# Altium integrated library Connectores GAM.IntLib: 178 symbols (continued)
## MLX 7P 2.54mm (continued)
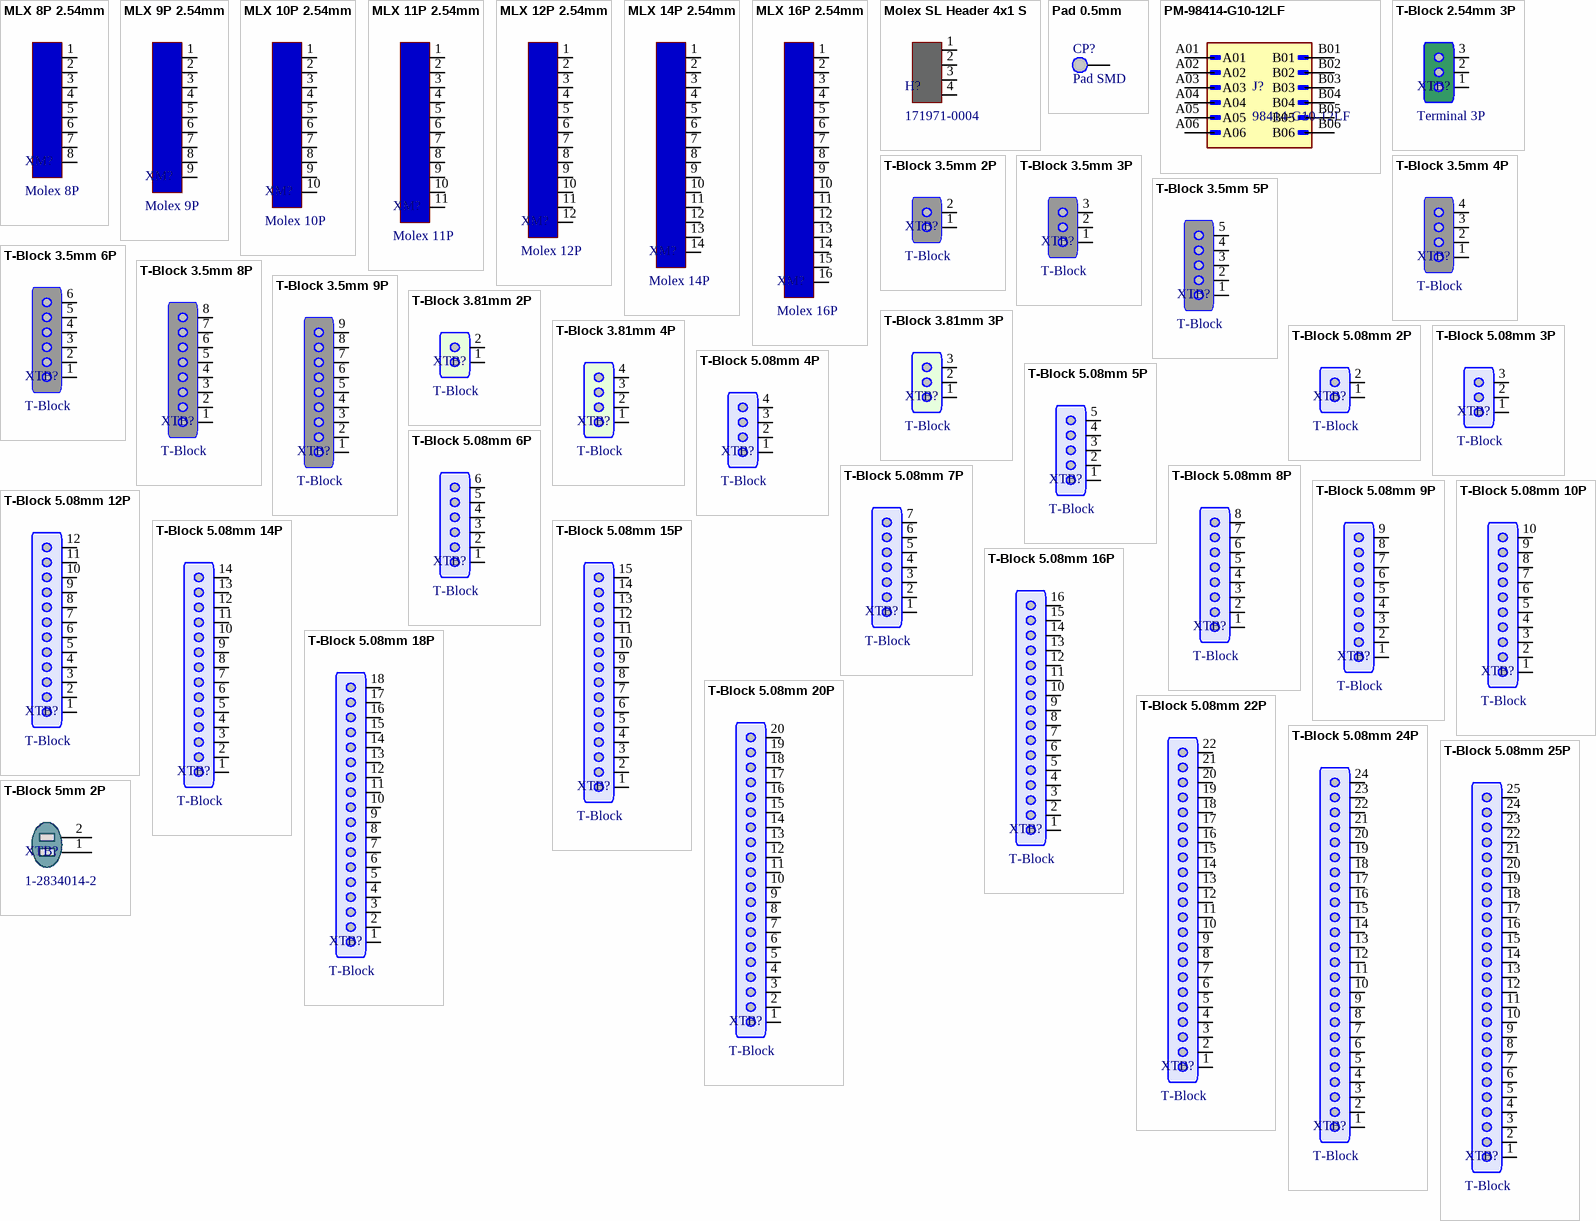
[diagram p2: symbols MLX 8P 2.54mm to T-Block 5mm 2P]

## MLX 8P 2.54mm
designator XM?, comment Molex 8P
Molex 8P 2.54mm
footprint Molex 8P 2.54mm
pins: 1, 2, 3, 4, 5, 6, 7, 8

## MLX 9P 2.54mm
designator XM?, comment Molex 9P
Molex 9P 2.54mm
footprint Molex 9P 2.54mm (Conector Tipo Molex 9P)
pins: 1, 2, 3, 4, 5, 6, 7, 8, 9

## MLX 10P 2.54mm
designator XM?, comment Molex 10P
Molex 10P 2.54mm
footprint Molex 10P 2.54mm (Conector Tipo Molex 10P)
pins: 1, 2, 3, 4, 5, 6, 7, 8, 9, 10

## MLX 11P 2.54mm
designator XM?, comment Molex 11P
Molex 11P 2.54mm
footprint Molex 11P 2.54mm (Conector Tipo Molex 11P)
pins: 1, 2, 3, 4, 5, 6, 7, 8, 9, 10, 11

## MLX 12P 2.54mm
designator XM?, comment Molex 12P
Molex 12P 2.54mm
footprint Molex 12P 2.54mm (Conector Tipo Molex 12P)
pins: 1, 2, 3, 4, 5, 6, 7, 8, 9, 10, 11, 12

## MLX 14P 2.54mm
designator XM?, comment Molex 14P
Molex 14P 2.54mm
footprint Molex 14P 2.54mm (Conector Tipo Molex 14P)
pins: 1, 2, 3, 4, 5, 6, 7, 8, 9, 10, 11, 12, 13, 14

## MLX 16P 2.54mm
designator XM?, comment Molex 16P
Molex 16P 2.54mm
footprint Molex 16P 2.54mm (Conector Tipo Molex 16P)
pins: 1, 2, 3, 4, 5, 6, 7, 8, 9, 10, 11, 12, 13, 14, 15, 16

## Molex SL Header 4x1 S
designator H?, comment 171971-0004
Molex 4P 2.54mm 171971-0004 Security Connector
footprint Molex 171971-0004 (Header Macho 171971-0004 Polaridad)
pins: 1, 2, 3, 4

## Pad 0.5mm
designator CP?, comment Pad SMD
footprint Pad 0.5mm (Pad 0.5mm x 1mm)
pins: 1 P

## PM-98414-G10-12LF
designator J?, comment 98414-G10-12LF
CONN HEADER VERT 12POS 2MM; Package: None; Price: None; Value: *; MP: 98414-G10-12LF; Availability: Unavailable
footprint AMPHENOL_98414-G10-12LF
pins: A01, A02, A03, A04, A05, A06, B01, B02, B03, B04, B05, B06

## T-Block 2.54mm 3P
designator XTB?, comment Terminal 3P
Terminal de Bloque 3P 2.54mm
footprint T-Block 3P 2.54mm (Terminal de Bloque 3P 2.54mm)
pins: 1, 2, 3

## T-Block 3.5mm 2P
designator XTB?, comment T-Block
Terminal de Bloque 2P 3.5mm 691412120002B
footprint T-BLOCK 2P 3.5mm (Terminal Block 2P 3.5mm)
pins: 1, 2

## T-Block 3.5mm 3P
designator XTB?, comment T-Block
Terminal de Bloque 3P 3.5mm 691412120003B
footprint T-BLOCK 3P 3.5mm (Terminal Block 3P 3.5mm)
pins: 1, 2, 3

## T-Block 3.5mm 4P
designator XTB?, comment T-Block
Terminal de Bloque 4P 3.5mm 691412120004B
footprint T-BLOCK 4P 3.5mm (Terminal Block 4P 3.5mm)
pins: 1, 2, 3, 4

## T-Block 3.5mm 5P
designator XTB?, comment T-Block
Terminal de Bloque 5P 3.5mm 691412120005B
footprint T-BLOCK 5P 3.5mm (Terminal Block 5P 3.5mm)
pins: 1, 2, 3, 4, 5

## T-Block 3.5mm 6P
designator XTB?, comment T-Block
Terminal de Bloque 6P 3.5mm 691412120006B
footprint T-BLOCK 6P 3.5mm (Terminal Block 6P 3.5mm)
pins: 1, 2, 3, 4, 5, 6

## T-Block 3.5mm 8P
designator XTB?, comment T-Block
Terminal de Bloque 8P 3.5mm 691412120008B
footprint T-BLOCK 8P 3.5mm (Terminal Block 8P 3.5mm)
pins: 1, 2, 3, 4, 5, 6, 7, 8

## T-Block 3.5mm 9P
designator XTB?, comment T-Block
Terminal de Bloque 9P 3.5mm 691412120009B
footprint T-BLOCK 9P 3.5mm (Terminal Block 9P 3.5mm)
pins: 1, 2, 3, 4, 5, 6, 7, 8, 9

## T-Block 3.81mm 2P
designator XTB?, comment T-Block
Terminal de Bloque 2P 3.81mm
footprint T-BLOCK 2P 3.81mm (Terminal Block 2P 3.81mm)
pins: 1, 2

## T-Block 3.81mm 3P
designator XTB?, comment T-Block
Terminal de Bloque 3P 3.81mm
footprint T-BLOCK 3P 3.81mm (Terminal de Bloque 3P 3.81mm)
pins: 1, 2, 3

## T-Block 3.81mm 4P
designator XTB?, comment T-Block
Terminal de Bloque 4P 3.81mm
footprint T-BLOCK 4P 3.81mm (Terminal de Bloque 4P 3.81mm)
pins: 1, 2, 3, 4

## T-Block 5.08mm 2P
designator XTB?, comment T-Block
Terminal de Bloque 2P 5.08mm
footprint T-BLOCK 2P 5.08MM (Terminal de Bloque 2P 5.08mm)
pins: 1, 2

## T-Block 5.08mm 3P
designator XTB?, comment T-Block
Terminal de Bloque 3P 5.08mm
footprint T-BLOCK 3P 5.08mm (Terminal Block 3P 5.08mm)
pins: 1, 2, 3

## T-Block 5.08mm 4P
designator XTB?, comment T-Block
Terminal de Bloque 4P 5.08mm
footprint T-BLOCK 4P 5.08mm (Terminal Block 4P 5.08mm)
pins: 1, 2, 3, 4

## T-Block 5.08mm 5P
designator XTB?, comment T-Block
Terminal de Bloque 5P 5.08mm
footprint T-BLOCK 5P 5.08mm (Terminal Block 5P 5.08mm)
pins: 1, 2, 3, 4, 5

## T-Block 5.08mm 6P
designator XTB?, comment T-Block
Terminal de Bloque 6P 5.08mm
footprint T-BLOCK 6P 5.08mm (Terminal Block 6P 5.08mm)
pins: 1, 2, 3, 4, 5, 6

## T-Block 5.08mm 7P
designator XTB?, comment T-Block
Terminal de Bloque 7P 5.08mm
footprint T-BLOCK 7P 5.08mm (Terminal Block 7P 5.08mm)
pins: 1, 2, 3, 4, 5, 6, 7

## T-Block 5.08mm 8P
designator XTB?, comment T-Block
Terminal de Bloque 8P 5.08mm
footprint T-BLOCK 8P 5.08mm (Terminal de Bloque 8P 5.08mm)
pins: 1, 2, 3, 4, 5 2, 6 3, 7 2, 8 3

## T-Block 5.08mm 9P
designator XTB?, comment T-Block
Terminal de Bloque 9P 5.08mm
footprint T-BLOCK 9P 5.08mm (Terminal de Bloque 9P 5.08mm)
pins: 1, 2, 3, 4, 5 2, 6 3, 7 2, 8 3, 9

## T-Block 5.08mm 10P
designator XTB?, comment T-Block
Terminal de Bloque 10P 5.08mm
footprint T-BLOCK 10P 5.08mm (Terminal de Bloque 10P 5.08mm)
pins: 1, 2, 3, 4, 5, 6, 7, 8, 9, 10

## T-Block 5.08mm 12P
designator XTB?, comment T-Block
Terminal de Bloque 12P 5.08mm
footprint T-BLOCK 12P 5.08mm (Terminal de Bloque 12P 5.08mm)
pins: 1, 2, 3, 4, 5, 6, 7, 8, 9, 10, 11, 12

## T-Block 5.08mm 14P
designator XTB?, comment T-Block
Terminal de Bloque 14P 5.08mm
footprint T-BLOCK 14P 5.08mm (Terminal de Bloque 14P 5.08mm)
pins: 1, 2, 3, 4, 5, 6, 7, 8, 9, 10, 11, 12, 13, 14

## T-Block 5.08mm 15P
designator XTB?, comment T-Block
Terminal de Bloque 15P 5.08mm
footprint T-BLOCK 15P 5.08mm (Terminal de Bloque 15P 5.08mm)
pins: 1, 2, 3, 4, 5, 6, 7, 8, 9, 10, 11, 12, 13, 14, 15

## T-Block 5.08mm 16P
designator XTB?, comment T-Block
Terminal de Bloque 16P 5.08mm
footprint T-BLOCK 16P 5.08mm (Terminal de Bloque 16P 5.08mm)
pins: 1, 2, 3, 4, 5, 6, 7, 8, 9, 10, 11, 12, 13, 14, 15, 16

## T-Block 5.08mm 18P
designator XTB?, comment T-Block
Terminal de Bloque 18P 5.08mm
footprint T-BLOCK 18P 5.08mm (Terminal de Bloque 18P 5.08mm)
pins: 1, 2, 3, 4, 5, 6, 7, 8, 9, 10, 11, 12, 13, 14, 15, 16, 17, 18

## T-Block 5.08mm 20P
designator XTB?, comment T-Block
Terminal de Bloque 20P 5.08mm
footprint T-BLOCK 20P 5.08mm (Terminal de Bloque 20P 5.08mm)
pins: 1, 2, 3, 4, 5, 6, 7, 8, 9, 10, 11, 12, 13, 14, 15, 16, 17, 18, 19, 20

## T-Block 5.08mm 22P
designator XTB?, comment T-Block
Terminal de Bloque 22P 5.08mm
footprint T-BLOCK 22P 5.08mm (Terminal de Bloque 22P 5.08mm)
pins: 1, 2, 3, 4, 5, 6, 7, 8, 9, 10, 11, 12, 13, 14, 15, 16, 17, 18, 19, 20, 21, 22

## T-Block 5.08mm 24P
designator XTB?, comment T-Block
Terminal de Bloque 24P 5.08mm
footprint T-BLOCK 24P 5.08mm (Terminal de Bloque 24P 5.08mm)
pins: 1, 2, 3, 4, 5, 6, 7, 8, 9, 10, 11, 12, 13, 14, 15, 16, 17, 18, 19, 20, 21, 22, 23, 24

## T-Block 5.08mm 25P
designator XTB?, comment T-Block
Terminal de Bloque 25P 5.08mm
footprint T-BLOCK 25P 5.08mm (Terminal de Bloque 25P 5.08mm)
pins: 1, 2, 3, 4, 5, 6, 7, 8, 9, 10, 11, 12, 13, 14, 15, 16, 17, 18, 19, 20, 21, 22, 23, 24, 25

## T-Block 5mm 2P
designator XTB?, comment 1-2834014-2
Terminal de Bloque 2P 5.0mm TE 1-2834014-2
footprint T-BLOCK 2P 5.00 mm (Terminal de Bloque 2P 5mm TE 1-2834014-2)
pins: 1, 2

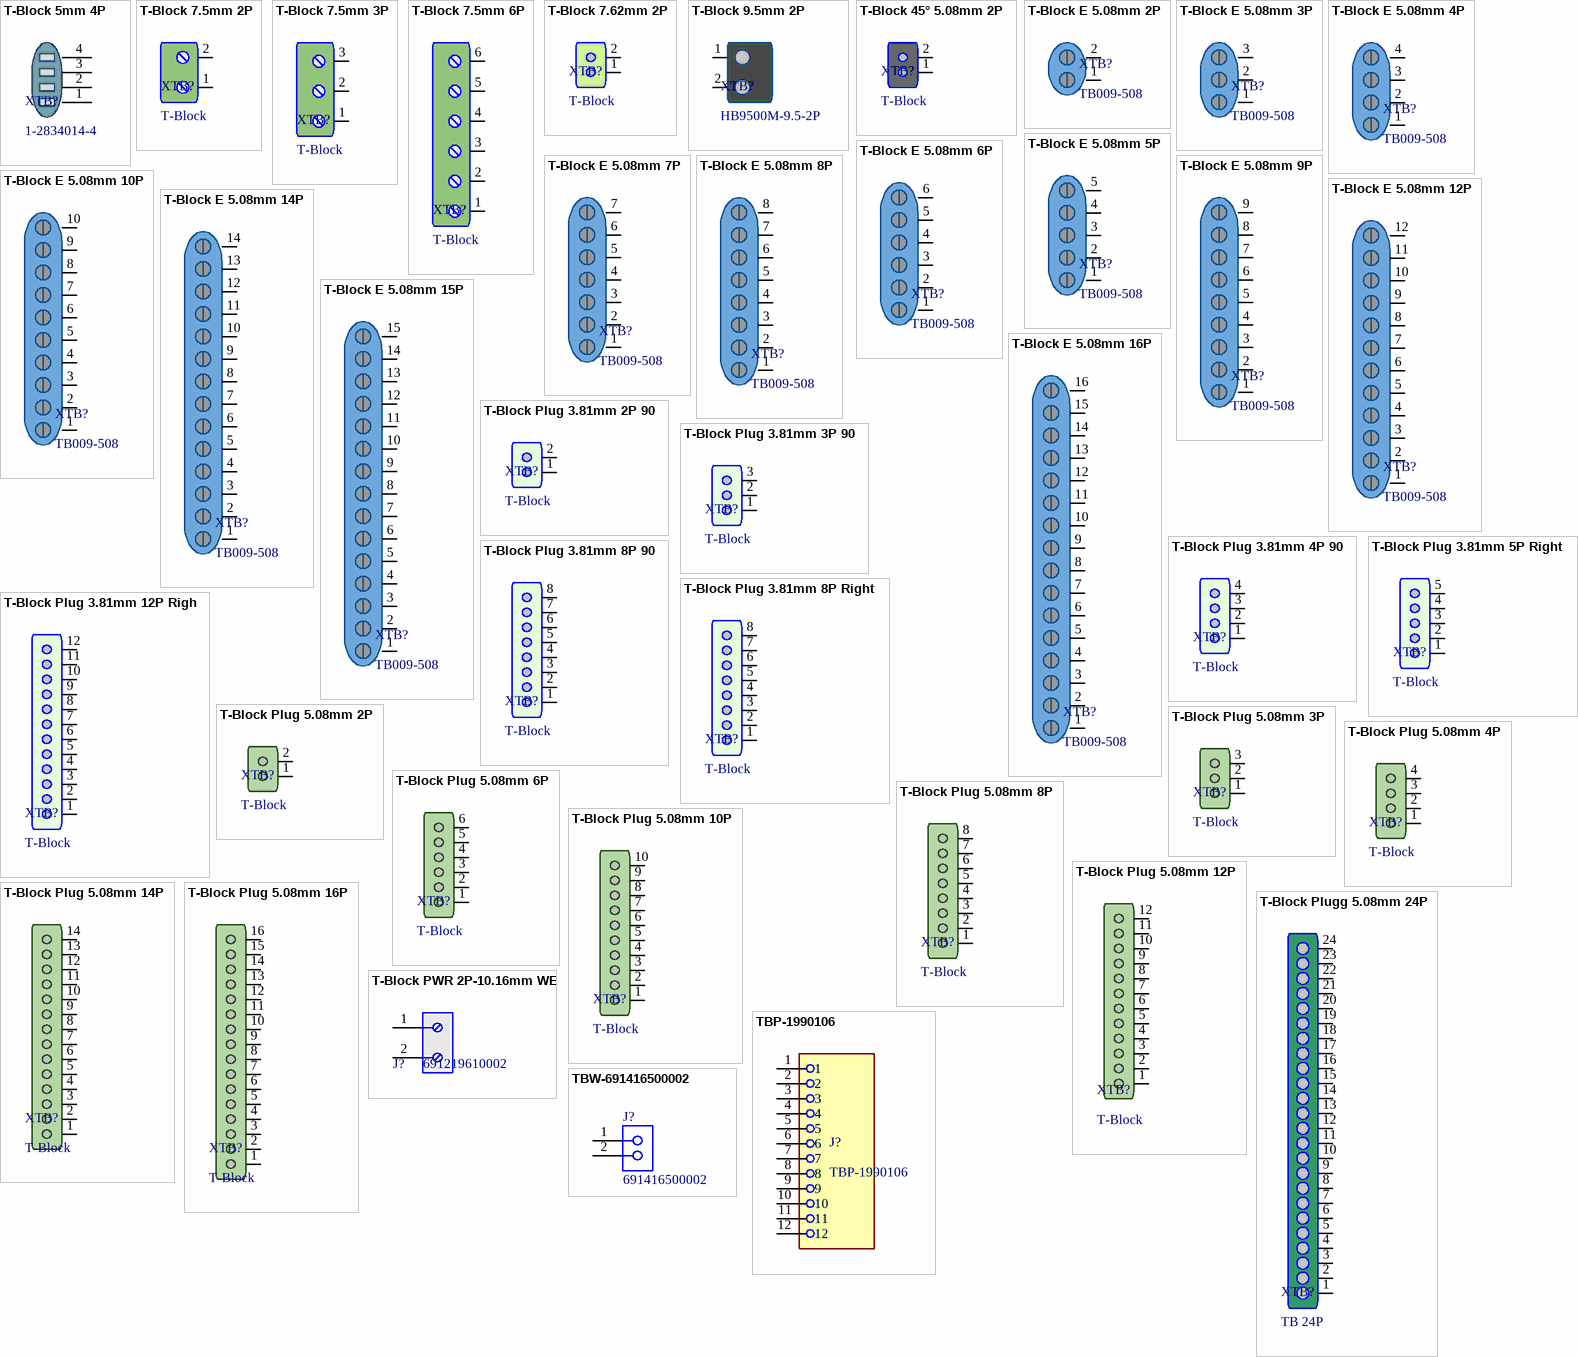
[diagram p3: symbols T-Block 5mm 4P to TBW-691416500002]

## T-Block 5mm 4P
designator XTB?, comment 1-2834014-4
Terminal de Bloque 4P 5.0mm TE 1-2834014-4
footprint T-BLOCK 4P 5.00 mm (Terminal de Bloque 4P 5mm TE 1-2834014-4)
pins: 1, 2, 3, 4

## T-Block 7.5mm 2P
designator XTB?, comment T-Block
Terminal de Bloque 2P 7.5mm #691137910002/WJ128V-7.5-2P
footprint T-BLOCK 2P 7.5MM (Terminal de Bloque 2P 7.5 mm)
pins: 1, 2

## T-Block 7.5mm 3P
designator XTB?, comment T-Block
Terminal de Bloque 3P 7.5mm
footprint T-BLOCK 3P 7.5MM (Terminal de Bloque 3P 7.5 mm)
pins: 1, 2, 3

## T-Block 7.5mm 6P
designator XTB?, comment T-Block
Terminal de Bloque 6P 7.5mm
footprint T-BLOCK 6P 7.5MM (Terminal de Bloque 6P 7.5 mm)
pins: 1, 2, 3, 4, 5, 6

## T-Block 7.62mm 2P
designator XTB?, comment T-Block
Terminal de Bloque 2P 37.62mm
footprint T-BLOCK 2P 7.62mm (Terminal de Bloque 7.62mm)
pins: 1, 2

## T-Block 9.5mm 2P
designator XTB?, comment HB9500M-9.5-2P
Terminal de Bloque 2P 9.5mm
footprint T-BLOCK 2P 9.5mm (Terminal de Bloque 9.5mm)
pins: 1, 2

## T-Block 45° 5.08mm 2P
designator XTB?, comment T-Block
Terminal de Bloque 2P 45° 5.08mm
footprint T-BLOCK 2P 45° 5.08MM (Terminal de Bloque 2P 45° 5.08mm)
pins: 1, 2

## T-Block E 5.08mm 2P
designator XTB?, comment TB009-508
Terminal de Bloque 2P 5.08mm High Current Euro Style TB009-508 CUI Devices
footprint T-BLOCK EURO 2P 5.08MM (Terminal de Bloque 2P 5.08mm EURO STYLE)
pins: 1, 2

## T-Block E 5.08mm 3P
designator XTB?, comment TB009-508
Terminal de Bloque 3P 5.08mm High Current Euro Style TB009-508 CUI Devices
footprint T-BLOCK EURO 3P 5.08MM (Terminal de Bloque 3P 5.08mm EURO STYLE)
pins: 1, 2, 3

## T-Block E 5.08mm 4P
designator XTB?, comment TB009-508
Terminal de Bloque 4P 5.08mm High Current Euro Style TB009-508 CUI Devices
footprint T-BLOCK EURO 4P 5.08MM (Terminal de Bloque 4P 5.08mm EURO STYLE)
pins: 1, 2, 3, 4

## T-Block E 5.08mm 5P
designator XTB?, comment TB009-508
Terminal de Bloque 5P 5.08mm High Current Euro Style TB009-508 CUI Devices
footprint T-BLOCK EURO 5P 5.08MM (Terminal de Bloque 5P 5.08mm EURO STYLE)
pins: 1, 2, 3, 4, 5

## T-Block E 5.08mm 6P
designator XTB?, comment TB009-508
Terminal de Bloque 6P 5.08mm High Current Euro Style TB009-508 CUI Devices
footprint T-BLOCK EURO 6P 5.08MM (Terminal de Bloque 6P 5.08mm EURO STYLE)
pins: 1, 2, 3, 4, 5, 6

## T-Block E 5.08mm 7P
designator XTB?, comment TB009-508
Terminal de Bloque 7P 5.08mm High Current Euro Style TB009-508 CUI Devices
footprint T-BLOCK EURO 7P 5.08MM (Terminal de Bloque 7P 5.08mm EURO STYLE)
pins: 1, 2, 3, 4, 5, 6, 7

## T-Block E 5.08mm 8P
designator XTB?, comment TB009-508
Terminal de Bloque 8P 5.08mm High Current Euro Style TB009-508 CUI Devices
footprint T-BLOCK EURO 8P 5.08MM (Terminal de Bloque 8P 5.08mm EURO STYLE)
pins: 1, 2, 3, 4, 5, 6, 7, 8

## T-Block E 5.08mm 9P
designator XTB?, comment TB009-508
Terminal de Bloque 9P 5.08mm High Current Euro Style TB009-508 CUI Devices
footprint T-BLOCK EURO 9P 5.08MM (Terminal de Bloque 9P 5.08mm EURO STYLE)
pins: 1, 2, 3, 4, 5, 6, 7, 8, 9

## T-Block E 5.08mm 10P
designator XTB?, comment TB009-508
Terminal de Bloque 10P 5.08mm High Current Euro Style TB009-508 CUI Devices
footprint T-BLOCK EURO 10P 5.08MM (Terminal de Bloque 10P 5.08mm EURO STYLE)
pins: 1, 2, 3, 4, 5, 6, 7, 8, 9, 10

## T-Block E 5.08mm 12P
designator XTB?, comment TB009-508
Terminal de Bloque 12P 5.08mm High Current Euro Style TB009-508 CUI Devices
footprint T-BLOCK EURO 12P 5.08MM (Terminal de Bloque 12P 5.08mm EURO STYLE)
pins: 1, 2, 3, 4, 5, 6, 7, 8, 9, 10, 11, 12

## T-Block E 5.08mm 14P
designator XTB?, comment TB009-508
Terminal de Bloque 14P 5.08mm High Current Euro Style TB009-508 CUI Devices
footprint T-BLOCK EURO 14P 5.08MM (Terminal de Bloque 14P 5.08mm EURO STYLE)
pins: 1, 2, 3, 4, 5, 6, 7, 8, 9, 10, 11, 12, 13, 14

## T-Block E 5.08mm 15P
designator XTB?, comment TB009-508
Terminal de Bloque 15P 5.08mm High Current Euro Style TB009-508 CUI Devices
footprint T-BLOCK EURO 15P 5.08MM (Terminal de Bloque 15P 5.08mm EURO STYLE)
pins: 1, 2, 3, 4, 5, 6, 7, 8, 9, 10, 11, 12, 13, 14, 15

## T-Block E 5.08mm 16P
designator XTB?, comment TB009-508
Terminal de Bloque 16P 5.08mm High Current Euro Style TB009-508 CUI Devices
footprint T-BLOCK EURO 16P 5.08MM (Terminal de Bloque 16P 5.08mm EURO STYLE)
pins: 1, 2, 3, 4, 5, 6, 7, 8, 9, 10, 11, 12, 13, 14, 15, 16

## T-Block Plug 3.81mm 2P 90
designator XTB?, comment T-Block
Terminal de Bloque 2P 3.81mm Desmontable 90 Grados
footprint T-BLOCK 2P 3.81MM Ang (TERMINAL BLOCK 3.81MM 2P)
pins: 1, 2

## T-Block Plug 3.81mm 3P 90
designator XTB?, comment T-Block
Terminal de Bloque 3P 3.81mm Desmontable 90 Grados
footprint T-BLOCK 3P 3.81MM Ang (TERMINAL BLOCK 3.81MM 3P)
pins: 1, 2, 3

## T-Block Plug 3.81mm 4P 90
designator XTB?, comment T-Block
Terminal de Bloque 4P 3.81mm Desmontable 90 Grados
footprint T-BLOCK 4P 3.81MM Ang (TERMINAL BLOCK 3.81MM 4P)
pins: 1, 2, 3, 4

## T-Block Plug 3.81mm 5P Right
designator XTB?, comment T-Block
Terminal de Bloque 5P 3.81mm Desmontable
footprint T-BLOCK 5P 3.81MM Ver (TERMINAL BLOCK 3.81MM 5P 691321300005)
pins: 1, 2, 3, 4, 5

## T-Block Plug 3.81mm 8P 90
designator XTB?, comment T-Block
Terminal de Bloque 8P 3.81mm Desmontable 90 Grados
footprint T-BLOCK 8PA 3.81MM Ang (TERMINAL BLOCK 3.81MM 8P)
pins: 1, 2, 3, 4, 5, 6, 7, 8

## T-Block Plug 3.81mm 8P Right
designator XTB?, comment T-Block
Terminal de Bloque 8P 3.81mm Desmontable
footprint T-BLOCK 8PA 3.81MM (TERMINAL BLOCK 3.81MM 8P)
pins: 1, 2, 3, 4, 5, 6, 7, 8

## T-Block Plug 3.81mm 12P Righ
designator XTB?, comment T-Block
Terminal de Bloque 12P 3.81mm Desmontable
footprint T-BLOCK 12P 3.81MM Ver (TERMINAL BLOCK 3.81MM 12P 691321300012)
pins: 1, 2, 3, 4, 5, 6, 7, 8, 9, 10, 11, 12

## T-Block Plug 5.08mm 2P
designator XTB?, comment T-Block
Terminal de Bloque Pluggeable 2P 5.08mm
footprint T-BLOCK 2P 5.08MM PLUG (Terminal de Bloque 2P 5.08mm 90)
pins: 1, 2

## T-Block Plug 5.08mm 3P
designator XTB?, comment T-Block
Terminal de Bloque 3P 5.08mm Pluggeable
footprint T-BLOCK 3P 5.08MM PLUG (Terminal de Bloque 3P 5.08mm 90)
pins: 1, 2, 3

## T-Block Plug 5.08mm 4P
designator XTB?, comment T-Block
Terminal de Bloque 4P 5.08mm Pluggeable
footprint T-BLOCK 4P 5.08MM PLUG (Terminal de Bloque 4P 5.08mm 90)
pins: 1, 2, 3, 4

## T-Block Plug 5.08mm 6P
designator XTB?, comment T-Block
Terminal de Bloque 6P 5.08mm Pluggeable
footprint T-BLOCK 6P 5.08MM PLUG (Terminal de Bloque 6P 5.08mm 90)
pins: 1, 2, 3, 4, 5, 6

## T-Block Plug 5.08mm 8P
designator XTB?, comment T-Block
Terminal de Bloque 8P 5.08mm Pluggeable
footprint T-BLOCK 8P 5.08MM PLUG (Terminal de Bloque 8P 5.08mm 90)
pins: 1, 2, 3, 4, 5, 6, 7, 8

## T-Block Plug 5.08mm 10P
designator XTB?, comment T-Block
Terminal de Bloque 10P 5.08mm Pluggeable
footprint T-BLOCK 10P 5.08MM PLUG (Terminal de Bloque 10P 5.08mm 90)
pins: 1, 2, 3, 4, 5, 6, 7, 8, 9, 10

## T-Block Plug 5.08mm 12P
designator XTB?, comment T-Block
Terminal de Bloque 12P 5.08mm Pluggeable
footprint T-BLOCK 12P 5.08MM PLUG (Terminal de Bloque 12P 5.08mm 90)
pins: 1, 2, 3, 4, 5, 6, 7, 8, 9, 10, 11, 12

## T-Block Plug 5.08mm 14P
designator XTB?, comment T-Block
Terminal de Bloque 14P 5.08mm Pluggeable
footprint T-BLOCK 14P 5.08MM PLUG (Terminal de Bloque 14P 5.08mm 90)
pins: 1, 2, 3, 4, 5, 6, 7, 8, 9, 10, 11, 12, 13, 14

## T-Block Plug 5.08mm 16P
designator XTB?, comment T-Block
Terminal de Bloque 16P 5.08mm Pluggeable
footprint T-BLOCK 16P 5.08MM PLUG (Terminal de Bloque 16P 5.08mm 90)
pins: 1, 2, 3, 4, 5, 6, 7, 8, 9, 10, 11, 12, 13, 14, 15, 16

## T-Block Plugg 5.08mm 24P
designator XTB?, comment TB 24P
Block Terminal Pluggeable 5.08mm 1759237
footprint TB 24P (Desmontable Terminal Block 24P 5.08mm)
pins: 1, 2, 3, 4, 5, 6, 7, 8, 9, 10, 11, 12, 13, 14, 15, 16, 17, 18, 19, 20, 21, 22, 23, 24

## T-Block PWR 2P-10.16mm WE
designator J?, comment 691219610002
WR-TBL Serie 2196 Horizontal Entry Modular, Rising Cage Clamp, THT, pitch 10.16mm, 2p; Manufacturer: Wurth Elektronik; Modularity: Yes; PCB/Cable/Panel: PCB; Pin Number: 2; Rated Current [UL]: 57A; Working Voltage [UL]: 300VAC; ComponentLink1Description: Manufacturer; ComponentLink1URL: http://www.we-online.de; ComponentLink2URL: https://katalog.we-online.de/em/datasheet/691219610002.pdf; ComponentLink2Description: Datasheet; Mounting Technology: THT; Manufacturer Part Number: 691219610002; Packaging: Box; Operating Temperature: -40 to +105degC; Pitch: 10.16mm; Published Date: Feburary 2021; Type: Horizontal; Application: Rising Cage Clamp
footprint 691219610002
footprint 691219610002 (Serie 2196 - 10.16 mm Horizontal Entry Modular WR-TBL, 2 pin)
pins: 1, 2

## TBP-1990106
designator J?
TERM BLOCK 12POS 45DEG 2.5MM PCB; MF: {'manufacturer': u'Phoenix Contact'}; Package: None; Price: None; Value: *; MP: 1990106; Availability: Unavailable
footprint PHOENIX_1990106
pins: 1, 2, 3, 4, 5, 6, 7, 8, 9, 10, 11, 12

## TBW-691416500002
designator J?, comment 691416500002
WR-TBL Series 4165 Vertical Entry, THT, pitch 5.08mm, 02p; Manufacturer: Wurth Elektronik; Modularity: No; Rated Current: 10A; System: Spring Clamp; Working Voltage: 300V; Manufacturer Part Number: 691416500002; Category: Terminal Block; Match Code: WR-TBL; ComponentLink1Description: Website Link; ComponentLink1URL: https://www.we-online.com/redexpert/article/691416500002?ad; ComponentLink2Description: Datasheet Link; ComponentLink2URL: https://www.we-online.com/redexpert/spec/691416500002?ad; Mount: Through Hole; Min Operating Temperature: -30°C; Max Operating Temperature: 120°C; Packaging: Box; Application: Screwless; Number of Pins: 2; Number of Rows: 1; Orientation: Vertical; Pitch: 5.08mm
footprint 691416500002
footprint 691416500002 (5.08 mm Screwless Vertical Entry, 2p)
pins: 1, 2

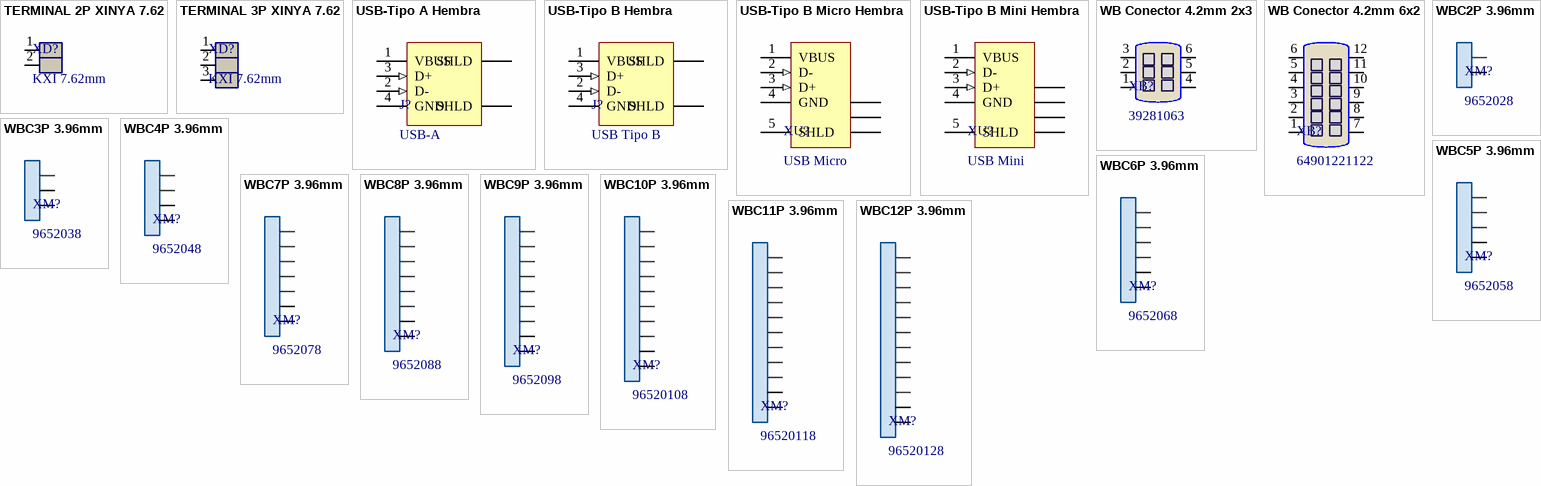
[diagram p4: symbols TERMINAL 2P XINYA 7.62 to WBC12P 3.96mm]

## TERMINAL 2P XINYA 7.62
designator XD?, comment KXI 7.62mm
FASTON PCB TERMINAL 2P
footprint XINYA 2P (Faston Connector 2P 7.62mm)
pins: 1, 2

## TERMINAL 3P XINYA 7.62
designator XD?, comment KXI 7.62mm
FASTON PCB TERMINAL 3P
footprint XINYA 3P (7.62MM TERMINAL FASTON)
pins: 1, 2, 3

## USB-Tipo A Hembra
designator J?, comment USB-A
USB Tipo A
footprint USB Tipo A
pins: 1 VBUS (power) "Power", 2 D- (in) "-DATA", 3 D+ (in) "+DATA", 4 GND (power) "Ground", 5 SHLD "Shield", 6 SHLD "Shield"

## USB-Tipo B Hembra
designator J?, comment USB Tipo B
footprint USB TIPO B
pins: 1 VBUS (power) "Power", 2 D- (in) "-DATA", 3 D+ (in) "+DATA", 4 GND (power) "Ground", 5 SHLD "Shield", 6 SHLD "Shield"

## USB-Tipo B Micro Hembra
designator XU?, comment USB Micro
footprint USB MICRO
pins: 1 VBUS (power) "Power", 2 D- (in) "-DATA", 3 D+ (in) "+DATA", 4 GND (power) "Ground", 5 SHLD "Shield", 6 SHLD "Shield", 7 SHLD "Shield", 8 SHLD "Shield"

## USB-Tipo B Mini Hembra
designator XU?, comment USB Mini
footprint USB MINI B
pins: 1 VBUS (power) "Power", 2 D- (in) "-DATA", 3 D+ (in) "+DATA", 4 GND (power) "Ground", 5 SHLD "Shield", 6 SHLD "Shield", 7 SHLD "Shield", 8 SHLD "Shield", 9 SHLD "Shield"

## WB Conector 4.2mm 2x3
designator XB?, comment 39281063
Wire to Board Connector 4.2mm Molex 39281063
footprint WBC 2X3 (Wire to Board Connector 2x3)
pins: 1, 2, 3, 4, 5, 6

## WB Conector 4.2mm 6x2
designator XB?, comment 64901221122
Wire to Board Connector 4.2mm Wurth 64901221122/ TE 1-2825272-2
footprint WBC 6X2 WR/TE (Wire to Board Connector 4.2mm 64901221122)
pins: 1, 2, 3, 4 3, 5, 6, 7, 8, 9, 10, 11, 12

## WBC2P 3.96mm
designator XM?, comment 9652028
Wire to Board conector Serie Molex 96520xx
footprint WBC 2P 3.96mm (Wire to Board Connector 3.96mm 2P)
pins: 1, 2

## WBC3P 3.96mm
designator XM?, comment 9652038
Wire to Board conector Serie Molex 96520xx
footprint WBC 3P 3.96mm (Wire to Board Connector 3.96mm 3P)
pins: 1, 2, 3

## WBC4P 3.96mm
designator XM?, comment 9652048
Wire to Board conector Serie Molex 96520xx
footprint WBC 4P 3.96mm (Wire to Board Connector 3.96mm 4P)
pins: 1, 2, 3, 4

## WBC5P 3.96mm
designator XM?, comment 9652058
Wire to Board conector Serie Molex 96520xx
footprint WBC 5P 3.96mm (Wire to Board Connector 3.96mm 5P)
pins: 1, 2, 3, 4, 5

## WBC6P 3.96mm
designator XM?, comment 9652068
Wire to Board conector Serie Molex 96520xx
footprint WBC 6P 3.96mm (Wire to Board Connector 3.96mm 6P)
pins: 1, 2, 3, 4, 5, 6

## WBC7P 3.96mm
designator XM?, comment 9652078
Wire to Board conector Serie Molex 96520xx
footprint WBC 7P 3.96mm (Wire to Board Connector 3.96mm 7P)
pins: 1, 2, 3, 4, 5, 6, 7

## WBC8P 3.96mm
designator XM?, comment 9652088
Wire to Board conector Serie Molex 96520xx
footprint WBC 8P 3.96mm (Wire to Board Connector 3.96mm 8P)
pins: 1, 2, 3, 4, 5, 6, 7, 8

## WBC9P 3.96mm
designator XM?, comment 9652098
Wire to Board conector Serie Molex 96520xx
footprint WBC 9P 3.96mm (Wire to Board Connector 3.96mm 9P)
pins: 1, 2, 3, 4, 5, 6, 7, 8, 9

## WBC10P 3.96mm
designator XM?, comment 96520108
Wire to Board conector Serie Molex 96520xx
footprint WBC 10P 3.96mm (Wire to Board Connector 3.96mm 10P)
pins: 1, 2, 3, 4, 5, 6, 7, 8, 9, 10

## WBC11P 3.96mm
designator XM?, comment 96520118
Wire to Board conector Serie Molex 96520xx
footprint WBC 11P 3.96mm (Wire to Board Connector 3.96mm 11P)
pins: 1, 2, 3, 4, 5, 6, 7, 8, 9, 10, 11

## WBC12P 3.96mm
designator XM?, comment 96520128
Wire to Board conector Serie Molex 96520xx
footprint WBC 12P 3.96mm (Wire to Board Connector 3.96mm 12P)
pins: 1, 2, 3, 4, 5, 6, 7, 8, 9, 10, 11, 12